# Altium integrated library RasUNMSM.IntLib: 33 symbols
Pins are listed as number, name and electrical type; pins without a type are passive.

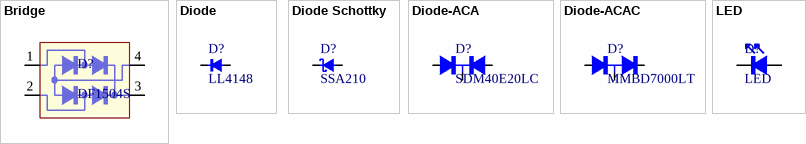
[diagram p0: symbols Bridge to LED]

## Bridge
designator D?, comment DF1504S
Bridge rectifier; Manufacturer: Diode; Part number: *; Unit price: *; Value: DF1504S
footprint SMD4-Gull (4-SMD, Gull wing)
pins: 1 AC, 2 AC, 3 +, 4 -

## Diode
designator D?, comment LL4148
General Purpose Diode Rectifier; Manufacturer: *; Part number: *; Value: LL4148; Unit price: 0.1
footprint SOD-80C (SOD-80C Package)
footprint SMB (SMB, DO-214AA -  Package)
footprint DO35-30 (DO35 - TH DIODE - Package)
footprint SMC (SMB, DO-214AB -  Package)
footprint SMA (SMA, DO-214AC -  Package)
footprint DO-27/DO-201AD (DO-27/DO-201AD - TH DIODE - Package)
footprint SOD-923 (SOD923 SOD-923)
footprint DO-41 (DO-41 / DO-204 - TH DIODE - Package)
pins: 1, 2

## Diode Schottky
designator D?, comment SSA210
Diode Schottky; Manufacturer: *; Part number: *; Value: SSA210; Unit price: 0.4
footprint SOD-80C (SOD-80C Package)
footprint SMB (SMB, DO-214AA -  Package)
footprint SOD123
footprint SOD123F
footprint SMC (SMB, DO-214AB -  Package)
footprint SOD323 (SOD323,  SC-76 (3.75mm x 0.65mm))
footprint SOD-923 (SOD923 SOD-923)
pins: 1, 2

## Diode-ACA
designator D?, comment SDM40E20LC
Diode - Array - Common cathode; Manufacturer: *; Part number: *; Unit price: *; Value: SDM40E20LC
footprint SOT23-3 (SOT23-3 Package)
pins: 1, 2, 3

## Diode-ACAC
designator D?, comment MMBD7000LT
Diode - Array - 1 pair series; Manufacturer: *; Part number: *; Unit price: *; Value: MMBD7000LT
footprint SOT23-3 (SOT23-3 Package)
pins: 1, 2, 3

## LED
designator D?
LED - Light-Emitting Diode; Manufacturer: *; Part number: *; Unit price: *; Value: LED
footprint LED-0805 (SMT LED DIODE 0805)
footprint LED-1210 (SMT LED DIODE 1210)
footprint LED-03MM (SMT LED DIODE 3 mm)
footprint LED-05MM (SMT LED DIODE 5 mm)
pins: 1, 2


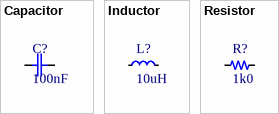
[diagram p1: symbols Capacitor to Resistor]

## Capacitor
designator C?, comment 100nF
Capacitor without polarity; Voltage: 25V; Part number: *; Manufacturer: *; Unit price: *; Value: 100nF
footprint C0805 (Ceramic capacitor 0805)
footprint C0603 (SMT CAPACITOR 0603)
footprint C1206 (SMT CAPACITOR 1206)
footprint C1210 (SMT CAPACITOR 1210)
footprint C1808 (SMT CAPACITOR 1808)
footprint C1812 (SMT CAPACITOR 1812)
footprint C2220 (SMT CAPACITOR 2220)
footprint C5040 (SMT CAPACITOR 5040)
footprint C6054 (SMT CAPACITOR 6054)
pins: 1, 2
1 alternate drawing of the same symbol

## Inductor
designator L?, comment 10uH
Inductor for low power; Max. current: 0.5A; Core type: Ferrite; Manufacturer: *; Part number: *; Value: 10uH; Unit price: 0.1
footprint L0603 (SMT INDUCTOR 0603)
footprint L0805 (SMT INDUCTOR 0805)
footprint L1210 (SMT INDUCTOR 1210)
footprint L1210-C (SMT INDUCTOR 1210)
footprint L1515-AH (SMT INDUCTOR 1515 - 4mm x 4mm)
pins: 1, 2

## Resistor
designator R?, comment 1k0
Single resistor; Power: 0.125W; Manufacturer: *; Part number: *; Value: 1k0; Unit price: 0.1
footprint R0603 (SMD RESISTOR 0603)
footprint R0805 (SMD RESISTOR 0805)
footprint R1206 (SMD RESISTOR 1206)
footprint R1210 (SMD RESISTOR 1210)
footprint R2512 (SMD RESISTOR 2512)
pins: 1, 2


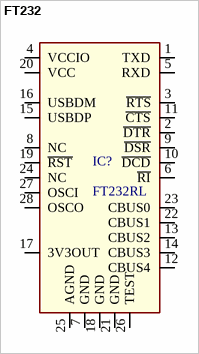
[diagram p2: symbol FT232]

## FT232
designator IC?, comment FT232RL
USB Bridge, USB to UART USB 2.0 UART Interface 28-SSOP; Value: FT232RL; Manufacturer: *; Part number: *; Unit price: *
footprint SSOP-28 (SSOP-28  / SSOP28)
pins: 1 TXD, 2 ~{DTR}, 3 ~{RTS}, 4 VCCIO, 5 RXD, 6 ~{RI}, 7 GND, 8 NC, 9 ~{DSR}, 10 ~{DCD}, 11 ~{CTS}, 12 CBUS4, 13 CBUS2, 14 CBUS3, 15 USBDP, 16 USBDM, 17 3V3OUT, 18 GND, 19 ~{RST}, 20 VCC, 21 GND, 22 CBUS1, 23 CBUS0, 24 NC, 25 AGND, 26 TEST, 27 OSCI, 28 OSCO


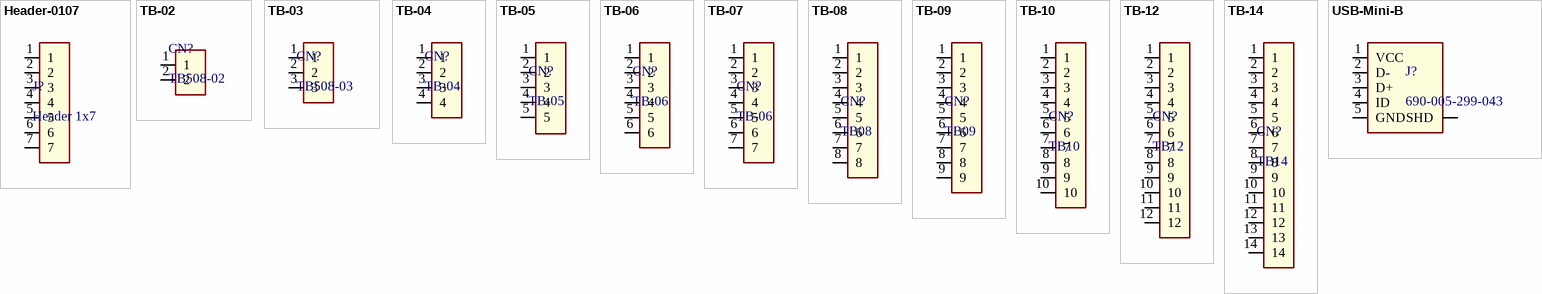
[diagram p3: symbols Header-0107 to USB-Mini-B]

## Header-0107
designator J?, comment Header 1x7
Rectangular Header; Value: Header 1x7; Part number: *; Manufacturer: *; Unit price: *
footprint Header-254-0107 (Rectangular header - Male pines 1x7 - 2.54mm pitch)
pins: 1, 2, 3, 4, 5, 6, 7

## TB-02
designator CN?, comment TB508-02
Terminal Block; Manufacturer: *; Part number: *; Unit price: *; Value: TB508-02
footprint TB508-02 (Vertical terminal block 0.2 inch (5.08mm) pitch)
footprint TB508V-02 (Vertical terminal block 0.2 inch (5.08mm) pitch)
footprint TBB953-02 (Vertical barrier terminal block 9.53mm pitch)
footprint TB762H-02 (Horizontal Terminal Block - PCB)
footprint TB762-02 (Vertical terminal block 7.62mm pitch)
footprint TB762A-02 (Angled terminal block 7.62mm pitch - 2 pines)
footprint TB750H-02 (Terminal block 7.50mm pitch)
footprint TB500-02 (Vertical terminal block 5.00mm pitch)
pins: 1, 2

## TB-03
designator CN?, comment TB508-03
Terminal Block; Manufacturer: *; Part number: *; Unit price: *; Value: TB508-03
footprint TB35H-03 (Vertical terminal block)
footprint TB35V-03 (Vertical terminal block)
footprint TB508-03 (Vertical terminal block 0.2 inch (5.08mm) pitch)
footprint TB350-03L (Horizontal terminal block - Wire to board - TE 284391)
footprint TB750-03-S (Vertical terminal block 7.50mm pitch)
footprint TB508V-03 (Vertical terminal block 0.2 inch (5.08mm) pitch)
footprint TBB953-03 (Vertical barrier terminal block 9.53mm pitch)
footprint TB381V-03 (Vertical terminal block 3.81mm)
footprint TB500-03 (Vertical terminal block 5.00mm pitch)
footprint TB508H-03 (Vertical terminal block 5.08mm pitch)
pins: 1, 2, 3

## TB-04
designator CN?
Terminal Block; Manufacturer: *; Part number: *; Unit price: *; Value: TB-04
footprint TB35H-04 (Vertical terminal block)
footprint TB35V-04 (Vertical terminal block)
footprint TB350-04 (Horizontal terminal block - Wire to board)
footprint TB350-04L (Horizontal terminal block - Wire to board - TE 284391)
footprint TB381V-04 (Vertical terminal block 3.81mm)
footprint TB508-04 (Vertical terminal block 0.2 inch (5.08mm) pitch)
footprint TB381V-04-WB (Vertical terminal block 3.81mm - Wire to Board)
footprint TB500-04 (Vertical terminal block 5.00mm pitch)
pins: 1, 2, 3, 4

## TB-05
designator CN?
Terminal Block; Manufacturer: *; Part number: *; Unit price: *; Value: TB-05
footprint TB35H-05 (Vertical terminal block)
footprint TB35V-05 (Vertical terminal block)
footprint TB254-05 (Horizontal terminal block - 2.54mm)
footprint TB350-05 (Horizontal terminal block - Wire to board)
footprint TB508-05 (Vertical terminal block 0.2 inch (5.08mm) pitch)
footprint TB350-05L (Horizontal terminal block - Wire to board - TE 284391)
footprint TB508A-05 (Angled terminal block 0.2 inch (5.08mm) pitch)
footprint TB381V-05-W (Wire connection 3.81mm)
footprint TB381V-05-WB (Vertical terminal block 3.81mm - Wire to Board)
footprint TB500-05 (Vertical terminal block 5.00mm pitch)
pins: 1, 2, 3, 4, 5

## TB-06
designator CN?
Terminal Block; Manufacturer: *; Part number: *; Unit price: *; Value: TB-06
footprint TB35H-06 (Vertical terminal block)
footprint TB35V-06 (Vertical terminal block)
footprint TB381V-06 (Vertical terminal block 3.81mm)
footprint TB381V-06-WB (Vertical terminal block 3.81mm - Wire to Board)
footprint TB500H-06 (Vertical terminal block 5.00mm pitch)
footprint TB500-06 (Vertical terminal block 5.00mm pitch)
pins: 1, 2, 3, 4, 5, 6

## TB-07
designator CN?, comment TB-06
Terminal Block; Manufacturer: *; Part number: *; Value: TB-06; Unit price: *
footprint TB254-07 (Horizontal terminal block - 2.54mm)
footprint TB500-07 (Vertical terminal block 5.00mm pitch)
pins: 1, 2, 3, 4, 5, 6, 7

## TB-08
designator CN?, comment TB08
Terminal Block; Manufacturer: *; Part number: *; Value: TB08; Unit price: *
footprint TB381V-08-WB (Vertical terminal block 3.81mm - Wire to Board)
footprint PHOENIX-UEG20-08-2790211 (Phoenix Contact - 2790211 - Enclosures, Boxes, & Cases ELECT. HOUSING)
footprint TB500H-08 (Vertical terminal block 5.00mm pitch)
footprint TB500-08 (Vertical terminal block 5.00mm pitch)
footprint TB508-08 (Vertical terminal block 0.2 inch (5.08mm) pitch)
pins: 1, 2, 3, 4, 5, 6, 7, 8

## TB-09
designator CN?, comment TB09
Terminal Block; Manufacturer: *; Part number: *; Value: TB09; Unit price: *
footprint TB750-09-S-FC (Vertical terminal block 7.50mm pitch. Field Control)
footprint TB500-09 (Vertical terminal block 5.00mm pitch)
pins: 1, 2, 3, 4, 5, 6, 7, 8, 9

## TB-10
designator CN?, comment TB10
Terminal Block; Manufacturer: *; Part number: *; Value: TB10; Unit price: *
footprint TB381V-10 (Vertical terminal block 3.81mm)
footprint TB500-10 (Vertical terminal block 5.00mm pitch)
pins: 1, 2, 3, 4, 5, 6, 7, 8, 9, 10

## TB-12
designator CN?, comment TB12
Terminal Block; Manufacturer: *; Part number: *; Value: TB12; Unit price: *
footprint TB500H-12 (Vertical terminal block 5.00mm pitch)
footprint TB508V-12 (Vertical terminal block 0.2 inch (5.08mm) pitch)
footprint TB508-12 (Vertical terminal block 0.2 inch (5.08mm) pitch)
pins: 1, 2, 3, 4, 5, 6, 7, 8, 9, 10, 11, 12

## TB-14
designator CN?, comment TB14
Terminal Block; Manufacturer: *; Part number: *; Value: TB14; Unit price: *
footprint TB381V-14 (Vertical terminal block 3.81mm)
pins: 1, 2, 3, 4, 5, 6, 7, 8, 9, 10, 11, 12, 13, 14

## USB-Mini-B
designator J?, comment 690-005-299-043
CONN RCPT USB2.0 MINI B SMD R/A; Manufacturer: *; Part number: *; Unit price: *; Value: 690-005-299-043
footprint USB-Mini (CONN RCPT USB2.0 MINI B SMD R/A)
pins: 1 VCC, 2 D-, 3 D+, 4 ID, 5 GND, SHD


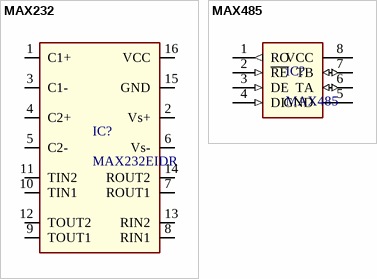
[diagram p4: symbols MAX232 to MAX485]

## MAX232
designator IC?, comment MAX232EIDR
2/2 Transceiver Full RS232 16-SOIC; Manufacturer: *; Unit price: *; Value: MAX232EIDR; Part number: *
footprint SOIC16-N (SOIC16, 16-SOIC (0.154", 3.90mm Width))
footprint SOIC16-N-S (SOIC16, 16-SOIC (0.154", 3.90mm Width) - S-PAD)
pins: 1 C1+, 2 Vs+, 3 C1-, 4 C2+, 5 C2-, 6 Vs-, 7 ROUT1, 8 RIN1, 9 TOUT1, 10 TIN1, 11 TIN2, 12 TOUT2, 13 RIN2, 14 ROUT2, 15 GND, 16 VCC

## MAX485
designator IC?
IC TRANSCEIVER HALF 1/1 8SOIC; Manufacturer: *; Part number: *; Unit price: *; Description: *; Value: MAX485
footprint SOIC8-N (SOIC8 - SO08 - SMALL OUTLINE INTEGRATED CIRCUIT)
pins: 1 RO (out), 2 ~{RE} (in), 3 DE (in), 4 DI (in), 5 GND (power), 6 TA (io), 7 TB (io), 8 VCC (power)


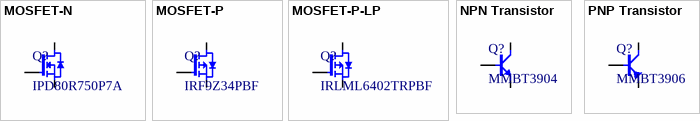
[diagram p5: symbols MOSFET-N to PNP Transistor]

## MOSFET-N
designator Q?, comment IPD80R750P7A
Canal N Montaje en superficie 800V 7 A (Tc) 51 W (Tc) PG-TO252-3; Part number: *; Manufacturer: *; Unit price: *; Value: IPD80R750P7A
footprint TO-252-2 (TO252-2, TO-252-2, DPak (2 Leads + Tab),  SC-63)
footprint TO-220 (TO220, TO-220)
footprint TO-247 (TO247, TO-247)
footprint TO-220AB-H (TO220AB-H,TO-220AB-H)
pins: 1 G, 2 D, 3 S

## MOSFET-P
designator Q?, comment IRF9Z34PBF
MOSFET 60V P-CH HEXFET; Part number: *; Manufacturer: *; Unit price: *; Value: IRF9Z34PBF
footprint TO-220AB-H (TO220AB-H,TO-220AB-H)
pins: 1 G, 2 D, 3 S

## MOSFET-P-LP
designator Q?, comment IRLML6402TRPBF
P-Channel 20V 3.7A (Ta) 1.3W (Ta) /SOT-23 - LowPower; Part number: *; Manufacturer: *; Unit price: *; Value: IRLML6402TRPBF
footprint SOT23-3 (SOT23-3 Package)
pins: 1 G, 2 S, 3 D

## NPN Transistor
designator Q?, comment MMBT3904
NPN Transistor; Part number: *; Manufacturer: *; Unit price: *; Value: MMBT3904
footprint SOT23-3 (SOT23-3 Package)
footprint TO-220-SMD (TO220-SMD, TO-220-SMD)
footprint TO-92-3 (TO92-3, TO-92-3)
footprint SOT223 (SOT223 Package (SC-73))
footprint SOT89-3N (SOT89, 3-Leads, Body 4.50x2.45mm, Pitch 1.50mm, Lead Span 4.1mm, IPC Medium Density)
pins: 1 B, 2 E, 3 C

## PNP Transistor
designator Q?, comment MMBT3906
PNP Transistor; Manufacturer: *; Part number: *; Value: MMBT3906; Unit price: *
footprint SOT23-3 (SOT23-3 Package)
footprint TO-92-3 (TO92-3, TO-92-3)
pins: 1 B, 2 E, 3 C


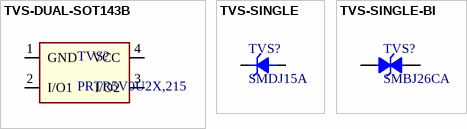
[diagram p6: symbols TVS-DUAL-SOT143B to TVS-SINGLE-BI]

## TVS-DUAL-SOT143B
designator TVS?, comment PRTR5V0U2X,215
Clamp  Ipp Tvs Diode Surface Mount SOT-143B; Part number: *; Manufacturer: *; Decription: *; Unit price: *; Value: PRTR5V0U2X,215
footprint SOT143-4 (SOT143-4 Package, TO-253-4, TO-253AA Case)
pins: 1 GND, 2 I/O1, 3 I/O2, 4 VCC

## TVS-SINGLE
designator TVS?, comment SMDJ15A
TVS DIODE - Transient Voltage Suppression Diode; Part number: *; Manufacturer: *; Decription: *; Unit price: *; Value: SMDJ15A
footprint SMB (SMB, DO-214AA -  Package)
footprint SMC (SMB, DO-214AB -  Package)
footprint SMA (SMA, DO-214AC -  Package)
footprint SOD123F
footprint SOD123
footprint SOD-923 (SOD923 SOD-923)
footprint SOD323 (SOD323,  SC-76 (3.75mm x 0.65mm))
pins: 1, 2

## TVS-SINGLE-BI
designator TVS?, comment SMBJ26CA
TVS DIODE 26V 42.1V SMB; Part number: *; Manufacturer: *; Decription: *; Unit price: *; Value: SMBJ26CA
footprint SMB (SMB, DO-214AA -  Package)
pins: 1, 2